# Altium schematic symbol library jlcpcb_2025_04_capacitors_extended_0805.schlib: 3281 symbols (part 6 of 18) (continued)
## C0805X7R105K500NT (continued)
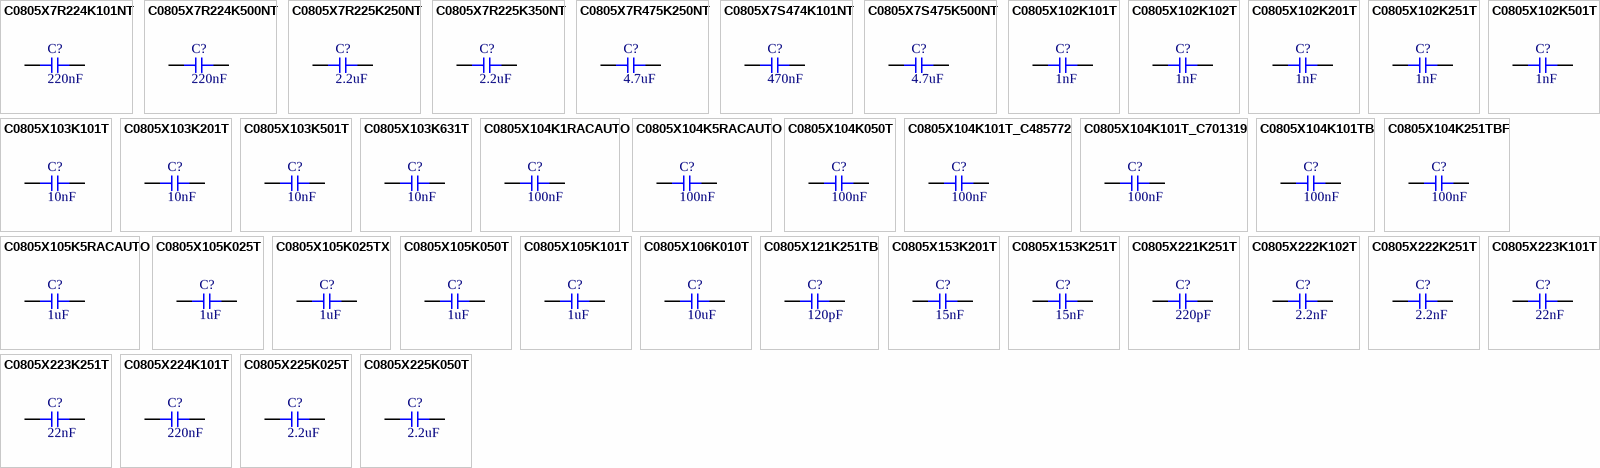
[diagram p25: symbols C0805X7R224K101NT to C0805X225K050T]

## C0805X7R224K101NT
designator C?  Capacitance: 220nF  (hidden comment: *)
Capacitor, Ceramic (MLCC), 220nF, ±10%, 100V, ±10%, SMD 0805; Manufacturer: SANYEAR; Manufacturer Part Number: C0805X7R224K101NT; Package Size: 0805; JLCPCB Basic Part: No; JLCPCB Part Number: C729464; Supplier 1: LCSC; Category: Capacitors - MLCC; Supplier Part Number 1: C729464; Tolerance: ±10%; Voltage Rating: 100V; RoHS: Yes; ComponentLink1Description: Datasheet; ComponentLink1URL: https://wmsc.lcsc.com/wmsc/upload/file/pdf/v2/lcsc/2304140030_SANYEAR-C0805X7R224K101NT_C729464.pdf; ComponentLink2Description: JLCPCB Part URL; ComponentLink2URL: https://jlcpcb.com/partdetail/C729464; ComponentLink3Description: LCSC Part URL; ComponentLink3URL: https://lcsc.com/product-detail/Multilayer-Ceramic-Capacitors-MLCC---SMD-SMT_SANYEAR-SANYEAR-C0805X7R224K101NT_C729464.html
footprint CAP-0805 (0805 (2012M) Capacitor)
pins: 1, 2

## C0805X7R224K500NT
designator C?  Capacitance: 220nF  (hidden comment: *)
Capacitor, Ceramic (MLCC), 220nF, ±10%, 50V, X7R, ±10%, SMD 0805; Manufacturer: SANYEAR; Manufacturer Part Number: C0805X7R224K500NT; Package Size: 0805; JLCPCB Basic Part: No; JLCPCB Part Number: C729463; Supplier 1: LCSC; Category: Capacitors - MLCC; Supplier Part Number 1: C729463; Tolerance: ±10%; Voltage Rating: 50V; Temperature Coefficient: X7R; RoHS: Yes; ComponentLink1Description: Datasheet; ComponentLink1URL: https://wmsc.lcsc.com/wmsc/upload/file/pdf/v2/lcsc/2304140030_SANYEAR-C0805X7R224K500NT_C729463.pdf; ComponentLink2Description: JLCPCB Part URL; ComponentLink2URL: https://jlcpcb.com/partdetail/C729463; ComponentLink3Description: LCSC Part URL; ComponentLink3URL: https://lcsc.com/product-detail/Multilayer-Ceramic-Capacitors-MLCC---SMD-SMT_SANYEAR-SANYEAR-C0805X7R224K500NT_C729463.html
footprint CAP-0805 (0805 (2012M) Capacitor)
pins: 1, 2

## C0805X7R225K250NT
designator C?  Capacitance: 2.2uF  (hidden comment: *)
Capacitor, Ceramic (MLCC), 2.2uF, ±10%, 25V, X7R, ±10%, SMD 0805; Manufacturer: SANYEAR; Manufacturer Part Number: C0805X7R225K250NT; Package Size: 0805; JLCPCB Basic Part: No; JLCPCB Part Number: C466790; Supplier 1: LCSC; Category: Capacitors - MLCC; Supplier Part Number 1: C466790; Tolerance: ±10%; Voltage Rating: 25V; Temperature Coefficient: X7R; RoHS: Yes; ComponentLink1Description: Datasheet; ComponentLink1URL: https://wmsc.lcsc.com/wmsc/upload/file/pdf/v2/lcsc/2304140030_SANYEAR-C0805X7R225K250NT_C466790.pdf; ComponentLink2Description: JLCPCB Part URL; ComponentLink2URL: https://jlcpcb.com/partdetail/C466790; ComponentLink3Description: LCSC Part URL; ComponentLink3URL: https://lcsc.com/product-detail/Multilayer-Ceramic-Capacitors-MLCC---SMD-SMT_SANYEAR-SANYEAR-C0805X7R225K250NT_C466790.html
footprint CAP-0805 (0805 (2012M) Capacitor)
pins: 1, 2

## C0805X7R225K350NT
designator C?  Capacitance: 2.2uF  (hidden comment: *)
Capacitor, Ceramic (MLCC), 2.2uF, ±10%, 35V, ±10%, SMD 0805; Manufacturer: SANYEAR; Manufacturer Part Number: C0805X7R225K350NT; Package Size: 0805; JLCPCB Basic Part: No; JLCPCB Part Number: C968783; Supplier 1: LCSC; Category: Capacitors - MLCC; Supplier Part Number 1: C968783; Tolerance: ±10%; Voltage Rating: 35V; RoHS: Yes; ComponentLink1Description: Datasheet; ComponentLink2Description: JLCPCB Part URL; ComponentLink2URL: https://jlcpcb.com/partdetail/C968783; ComponentLink3Description: LCSC Part URL; ComponentLink3URL: https://lcsc.com/product-detail/Multilayer-Ceramic-Capacitors-MLCC---SMD-SMT_SANYEAR-SANYEAR-C0805X7R225K350NT_C968783.html
footprint CAP-0805 (0805 (2012M) Capacitor)
pins: 1, 2

## C0805X7R475K250NT
designator C?  Capacitance: 4.7uF  (hidden comment: *)
Capacitor, Ceramic (MLCC), 4.7uF, 25V, SMD 0805; Manufacturer: SANYEAR; Manufacturer Part Number: C0805X7R475K250NT; Package Size: 0805; JLCPCB Basic Part: No; JLCPCB Part Number: C2835535; Supplier 1: LCSC; Category: Capacitors - MLCC; Supplier Part Number 1: C2835535; Voltage Rating: 25V; RoHS: Yes; ComponentLink1Description: Datasheet; ComponentLink1URL: https://wmsc.lcsc.com/wmsc/upload/file/pdf/v2/lcsc/2304140030_SANYEAR-C0805X7R475K250NT_C2835535.pdf; ComponentLink2Description: JLCPCB Part URL; ComponentLink2URL: https://jlcpcb.com/partdetail/C2835535; ComponentLink3Description: LCSC Part URL; ComponentLink3URL: https://lcsc.com/product-detail/Multilayer-Ceramic-Capacitors-MLCC---SMD-SMT_SANYEAR-SANYEAR-C0805X7R475K250NT_C2835535.html
footprint CAP-0805 (0805 (2012M) Capacitor)
pins: 1, 2

## C0805X7S474K101NT
designator C?  Capacitance: 470nF  (hidden comment: *)
Capacitor, Ceramic (MLCC), 470nF, ±10%, 100V, X7S, ±10%, SMD 0805; Manufacturer: SANYEAR; Manufacturer Part Number: C0805X7S474K101NT; Package Size: 0805; JLCPCB Basic Part: No; JLCPCB Part Number: C2859185; Supplier 1: LCSC; Category: Capacitors - MLCC; Supplier Part Number 1: C2859185; Tolerance: ±10%; Voltage Rating: 100V; Temperature Coefficient: X7S; RoHS: Yes; ComponentLink1Description: Datasheet; ComponentLink1URL: https://wmsc.lcsc.com/wmsc/upload/file/pdf/v2/lcsc/2108170930_SANYEAR-C0805X7S474K101NT_C2859185.pdf; ComponentLink2Description: JLCPCB Part URL; ComponentLink2URL: https://jlcpcb.com/partdetail/C2859185; ComponentLink3Description: LCSC Part URL; ComponentLink3URL: https://lcsc.com/product-detail/Multilayer-Ceramic-Capacitors-MLCC---SMD-SMT_SANYEAR-SANYEAR-C0805X7S474K101NT_C2859185.html
footprint CAP-0805 (0805 (2012M) Capacitor)
pins: 1, 2

## C0805X7S475K500NT
designator C?  Capacitance: 4.7uF  (hidden comment: *)
Capacitor, Ceramic (MLCC), 4.7uF, ±10%, 50V, X7S, ±10%, SMD 0805; Manufacturer: SANYEAR; Manufacturer Part Number: C0805X7S475K500NT; Package Size: 0805; JLCPCB Basic Part: No; JLCPCB Part Number: C2859194; Supplier 1: LCSC; Category: Capacitors - MLCC; Supplier Part Number 1: C2859194; Tolerance: ±10%; Voltage Rating: 50V; Temperature Coefficient: X7S; RoHS: Yes; ComponentLink1Description: Datasheet; ComponentLink1URL: https://wmsc.lcsc.com/wmsc/upload/file/pdf/v2/lcsc/2108170930_SANYEAR-C0805X7S475K500NT_C2859194.pdf; ComponentLink2Description: JLCPCB Part URL; ComponentLink2URL: https://jlcpcb.com/partdetail/C2859194; ComponentLink3Description: LCSC Part URL; ComponentLink3URL: https://lcsc.com/product-detail/Multilayer-Ceramic-Capacitors-MLCC---SMD-SMT_SANYEAR-SANYEAR-C0805X7S475K500NT_C2859194.html
footprint CAP-0805 (0805 (2012M) Capacitor)
pins: 1, 2

## C0805X102K101T
designator C?  Capacitance: 1nF  (hidden comment: *)
Capacitor, Ceramic (MLCC), 1nF, ±10%, 100V, X7R, ±10%, SMD 0805; Manufacturer: IHHEC(HOLY STONE ENTERPRISE CO., LTD); Manufacturer Part Number: C0805X102K101T; Package Size: 0805; JLCPCB Basic Part: No; JLCPCB Part Number: C559288; Supplier 1: LCSC; Category: Capacitors - MLCC; Supplier Part Number 1: C559288; Tolerance: ±10%; Voltage Rating: 100V; Temperature Coefficient: X7R; RoHS: Yes; ComponentLink1Description: Datasheet; ComponentLink1URL: https://wmsc.lcsc.com/wmsc/upload/file/pdf/v2/lcsc/2304140030_IHHEC-HOLY-STONE-ENTERPRISE-CO---LTD-C0805X102K101T_C559288.pdf; ComponentLink2Description: JLCPCB Part URL; ComponentLink2URL: https://jlcpcb.com/partdetail/C559288; ComponentLink3Description: LCSC Part URL; ComponentLink3URL: https://lcsc.com/product-detail/Multilayer-Ceramic-Capacitors-MLCC---SMD-SMT_IHHECHOLY-STONE-ENTERPRISE-CO.%2C-LTD-IHHECHOLY-STONE-ENTERPRISE-CO.%2C-LTD-C0805X102K101T_C559288.html
footprint CAP-0805 (0805 (2012M) Capacitor)
pins: 1, 2

## C0805X102K102T
designator C?  Capacitance: 1nF  (hidden comment: *)
Capacitor, Ceramic (MLCC), 1nF, ±10%, 1kV, X7R, ±10%, SMD 0805; Manufacturer: IHHEC(HOLY STONE ENTERPRISE CO., LTD); Manufacturer Part Number: C0805X102K102T; Package Size: 0805; JLCPCB Basic Part: No; JLCPCB Part Number: C105944; Supplier 1: LCSC; Category: Capacitors - MLCC; Supplier Part Number 1: C105944; Tolerance: ±10%; Voltage Rating: 1kV; Temperature Coefficient: X7R; RoHS: Yes; ComponentLink1Description: Datasheet; ComponentLink1URL: https://wmsc.lcsc.com/wmsc/upload/file/pdf/v2/lcsc/2304140030_IHHEC-HOLY-STONE-ENTERPRISE-CO---LTD-C0805X102K102T_C105944.pdf; ComponentLink2Description: JLCPCB Part URL; ComponentLink2URL: https://jlcpcb.com/partdetail/C105944; ComponentLink3Description: LCSC Part URL; ComponentLink3URL: https://lcsc.com/product-detail/Multilayer-Ceramic-Capacitors-MLCC---SMD-SMT_IHHECHOLY-STONE-ENTERPRISE-CO.%2C-LTD-IHHECHOLY-STONE-ENTERPRISE-CO.%2C-LTD-C0805X102K102T_C105944.html
footprint CAP-0805 (0805 (2012M) Capacitor)
pins: 1, 2

## C0805X102K201T
designator C?  Capacitance: 1nF  (hidden comment: *)
Capacitor, Ceramic (MLCC), 1nF, ±10%, 200V, X7R, ±10%, SMD 0805; Manufacturer: IHHEC(HOLY STONE ENTERPRISE CO., LTD); Manufacturer Part Number: C0805X102K201T; Package Size: 0805; JLCPCB Basic Part: No; JLCPCB Part Number: C559286; Supplier 1: LCSC; Category: Capacitors - MLCC; Supplier Part Number 1: C559286; Tolerance: ±10%; Voltage Rating: 200V; Temperature Coefficient: X7R; RoHS: Yes; ComponentLink1Description: Datasheet; ComponentLink1URL: https://wmsc.lcsc.com/wmsc/upload/file/pdf/v2/lcsc/2304140030_IHHEC-HOLY-STONE-ENTERPRISE-CO---LTD-C0805X102K201T_C559286.pdf; ComponentLink2Description: JLCPCB Part URL; ComponentLink2URL: https://jlcpcb.com/partdetail/C559286; ComponentLink3Description: LCSC Part URL; ComponentLink3URL: https://lcsc.com/product-detail/Multilayer-Ceramic-Capacitors-MLCC---SMD-SMT_IHHECHOLY-STONE-ENTERPRISE-CO.%2C-LTD-IHHECHOLY-STONE-ENTERPRISE-CO.%2C-LTD-C0805X102K201T_C559286.html
footprint CAP-0805 (0805 (2012M) Capacitor)
pins: 1, 2

## C0805X102K251T
designator C?  Capacitance: 1nF  (hidden comment: *)
Capacitor, Ceramic (MLCC), 1nF, ±10%, 250V, X7R, ±10%, SMD 0805; Manufacturer: IHHEC(HOLY STONE ENTERPRISE CO., LTD); Manufacturer Part Number: C0805X102K251T; Package Size: 0805; JLCPCB Basic Part: No; JLCPCB Part Number: C105945; Supplier 1: LCSC; Category: Capacitors - MLCC; Supplier Part Number 1: C105945; Tolerance: ±10%; Voltage Rating: 250V; Temperature Coefficient: X7R; RoHS: Yes; ComponentLink1Description: Datasheet; ComponentLink1URL: https://wmsc.lcsc.com/wmsc/upload/file/pdf/v2/lcsc/2304140030_IHHEC-HOLY-STONE-ENTERPRISE-CO---LTD-C0805X102K251T_C105945.pdf; ComponentLink2Description: JLCPCB Part URL; ComponentLink2URL: https://jlcpcb.com/partdetail/C105945; ComponentLink3Description: LCSC Part URL; ComponentLink3URL: https://lcsc.com/product-detail/Multilayer-Ceramic-Capacitors-MLCC---SMD-SMT_IHHECHOLY-STONE-ENTERPRISE-CO.%2C-LTD-IHHECHOLY-STONE-ENTERPRISE-CO.%2C-LTD-C0805X102K251T_C105945.html
footprint CAP-0805 (0805 (2012M) Capacitor)
pins: 1, 2

## C0805X102K501T
designator C?  Capacitance: 1nF  (hidden comment: *)
Capacitor, Ceramic (MLCC), 1nF, ±10%, 500V, X7R, ±10%, SMD 0805; Manufacturer: IHHEC(HOLY STONE ENTERPRISE CO., LTD); Manufacturer Part Number: C0805X102K501T; Package Size: 0805; JLCPCB Basic Part: No; JLCPCB Part Number: C105946; Supplier 1: LCSC; Category: Capacitors - MLCC; Supplier Part Number 1: C105946; Tolerance: ±10%; Voltage Rating: 500V; Temperature Coefficient: X7R; RoHS: Yes; ComponentLink1Description: Datasheet; ComponentLink1URL: https://wmsc.lcsc.com/wmsc/upload/file/pdf/v2/lcsc/2304140030_IHHEC-HOLY-STONE-ENTERPRISE-CO---LTD-C0805X102K501T_C105946.pdf; ComponentLink2Description: JLCPCB Part URL; ComponentLink2URL: https://jlcpcb.com/partdetail/C105946; ComponentLink3Description: LCSC Part URL; ComponentLink3URL: https://lcsc.com/product-detail/Multilayer-Ceramic-Capacitors-MLCC---SMD-SMT_IHHECHOLY-STONE-ENTERPRISE-CO.%2C-LTD-IHHECHOLY-STONE-ENTERPRISE-CO.%2C-LTD-C0805X102K501T_C105946.html
footprint CAP-0805 (0805 (2012M) Capacitor)
pins: 1, 2

## C0805X103K101T
designator C?  Capacitance: 10nF  (hidden comment: *)
Capacitor, Ceramic (MLCC), 10nF, ±10%, 100V, X7R, ±10%, SMD 0805; Manufacturer: IHHEC(HOLY STONE ENTERPRISE CO., LTD); Manufacturer Part Number: C0805X103K101T; Package Size: 0805; JLCPCB Basic Part: No; JLCPCB Part Number: C105947; Supplier 1: LCSC; Category: Capacitors - MLCC; Supplier Part Number 1: C105947; Tolerance: ±10%; Voltage Rating: 100V; Temperature Coefficient: X7R; RoHS: Yes; ComponentLink1Description: Datasheet; ComponentLink1URL: https://wmsc.lcsc.com/wmsc/upload/file/pdf/v2/lcsc/2304140030_IHHEC-HOLY-STONE-ENTERPRISE-CO---LTD-C0805X103K101T_C105947.pdf; ComponentLink2Description: JLCPCB Part URL; ComponentLink2URL: https://jlcpcb.com/partdetail/C105947; ComponentLink3Description: LCSC Part URL; ComponentLink3URL: https://lcsc.com/product-detail/Multilayer-Ceramic-Capacitors-MLCC---SMD-SMT_IHHECHOLY-STONE-ENTERPRISE-CO.%2C-LTD-IHHECHOLY-STONE-ENTERPRISE-CO.%2C-LTD-C0805X103K101T_C105947.html
footprint CAP-0805 (0805 (2012M) Capacitor)
pins: 1, 2

## C0805X103K201T
designator C?  Capacitance: 10nF  (hidden comment: *)
Capacitor, Ceramic (MLCC), 10nF, ±10%, 200V, X7R, ±10%, SMD 0805; Manufacturer: IHHEC(HOLY STONE ENTERPRISE CO., LTD); Manufacturer Part Number: C0805X103K201T; Package Size: 0805; JLCPCB Basic Part: No; JLCPCB Part Number: C105948; Supplier 1: LCSC; Category: Capacitors - MLCC; Supplier Part Number 1: C105948; Tolerance: ±10%; Voltage Rating: 200V; Temperature Coefficient: X7R; RoHS: Yes; ComponentLink1Description: Datasheet; ComponentLink1URL: https://wmsc.lcsc.com/wmsc/upload/file/pdf/v2/lcsc/2304140030_IHHEC-HOLY-STONE-ENTERPRISE-CO---LTD-C0805X103K201T_C105948.pdf; ComponentLink2Description: JLCPCB Part URL; ComponentLink2URL: https://jlcpcb.com/partdetail/C105948; ComponentLink3Description: LCSC Part URL; ComponentLink3URL: https://lcsc.com/product-detail/Multilayer-Ceramic-Capacitors-MLCC---SMD-SMT_IHHECHOLY-STONE-ENTERPRISE-CO.%2C-LTD-IHHECHOLY-STONE-ENTERPRISE-CO.%2C-LTD-C0805X103K201T_C105948.html
footprint CAP-0805 (0805 (2012M) Capacitor)
pins: 1, 2

## C0805X103K501T
designator C?  Capacitance: 10nF  (hidden comment: *)
Capacitor, Ceramic (MLCC), 10nF, ±10%, 500V, X7R, ±10%, SMD 0805; Manufacturer: IHHEC(HOLY STONE ENTERPRISE CO., LTD); Manufacturer Part Number: C0805X103K501T; Package Size: 0805; JLCPCB Basic Part: No; JLCPCB Part Number: C105950; Supplier 1: LCSC; Category: Capacitors - MLCC; Supplier Part Number 1: C105950; Tolerance: ±10%; Voltage Rating: 500V; Temperature Coefficient: X7R; RoHS: Yes; ComponentLink1Description: Datasheet; ComponentLink1URL: https://wmsc.lcsc.com/wmsc/upload/file/pdf/v2/lcsc/2304140030_IHHEC-HOLY-STONE-ENTERPRISE-CO---LTD-C0805X103K501T_C105950.pdf; ComponentLink2Description: JLCPCB Part URL; ComponentLink2URL: https://jlcpcb.com/partdetail/C105950; ComponentLink3Description: LCSC Part URL; ComponentLink3URL: https://lcsc.com/product-detail/Multilayer-Ceramic-Capacitors-MLCC---SMD-SMT_IHHECHOLY-STONE-ENTERPRISE-CO.%2C-LTD-IHHECHOLY-STONE-ENTERPRISE-CO.%2C-LTD-C0805X103K501T_C105950.html
footprint CAP-0805 (0805 (2012M) Capacitor)
pins: 1, 2

## C0805X103K631T
designator C?  Capacitance: 10nF  (hidden comment: *)
Capacitor, Ceramic (MLCC), 10nF, ±10%, 630V, X7R, ±10%, SMD 0805; Manufacturer: IHHEC(HOLY STONE ENTERPRISE CO., LTD); Manufacturer Part Number: C0805X103K631T; Package Size: 0805; JLCPCB Basic Part: No; JLCPCB Part Number: C2998552; Supplier 1: LCSC; Category: Capacitors - MLCC; Supplier Part Number 1: C2998552; Tolerance: ±10%; Voltage Rating: 630V; Temperature Coefficient: X7R; RoHS: Yes; ComponentLink1Description: Datasheet; ComponentLink1URL: https://wmsc.lcsc.com/wmsc/upload/file/pdf/v2/lcsc/2205061616_IHHEC-HOLY-STONE-ENTERPRISE-CO---LTD-C0805X103K631T_C2998552.pdf; ComponentLink2Description: JLCPCB Part URL; ComponentLink2URL: https://jlcpcb.com/partdetail/C2998552; ComponentLink3Description: LCSC Part URL; ComponentLink3URL: https://lcsc.com/product-detail/Multilayer-Ceramic-Capacitors-MLCC---SMD-SMT_IHHECHOLY-STONE-ENTERPRISE-CO.%2C-LTD-IHHECHOLY-STONE-ENTERPRISE-CO.%2C-LTD-C0805X103K631T_C2998552.html
footprint CAP-0805 (0805 (2012M) Capacitor)
pins: 1, 2

## C0805X104K1RACAUTO
designator C?  Capacitance: 100nF  (hidden comment: *)
Capacitor, Ceramic (MLCC), 100nF, ±10%, 100V, X7R, ±10%, SMD 0805; Manufacturer: KEMET; Manufacturer Part Number: C0805X104K1RACAUTO; Package Size: 0805; JLCPCB Basic Part: No; JLCPCB Part Number: C561838; Supplier 1: LCSC; Category: Capacitors - MLCC; Supplier Part Number 1: C561838; Tolerance: ±10%; Voltage Rating: 100V; Temperature Coefficient: X7R; RoHS: Yes; ComponentLink1Description: Datasheet; ComponentLink1URL: https://wmsc.lcsc.com/wmsc/upload/file/pdf/v2/lcsc/2304140030_KEMET-C0805X104K1RACAUTO_C561838.pdf; ComponentLink2Description: JLCPCB Part URL; ComponentLink2URL: https://jlcpcb.com/partdetail/C561838; ComponentLink3Description: LCSC Part URL; ComponentLink3URL: https://lcsc.com/product-detail/Multilayer-Ceramic-Capacitors-MLCC---SMD-SMT_KEMET-KEMET-C0805X104K1RACAUTO_C561838.html
footprint CAP-0805 (0805 (2012M) Capacitor)
pins: 1, 2

## C0805X104K5RACAUTO
designator C?  Capacitance: 100nF  (hidden comment: *)
Capacitor, Ceramic (MLCC), 100nF, ±10%, 50V, X7R, ±10%, SMD 0805; Manufacturer: KEMET; Manufacturer Part Number: C0805X104K5RACAUTO; Package Size: 0805; JLCPCB Basic Part: No; JLCPCB Part Number: C141172; Supplier 1: LCSC; Category: Capacitors - MLCC; Supplier Part Number 1: C141172; Tolerance: ±10%; Voltage Rating: 50V; Temperature Coefficient: X7R; RoHS: Yes; ComponentLink1Description: Datasheet; ComponentLink1URL: https://wmsc.lcsc.com/wmsc/upload/file/pdf/v2/lcsc/2304140030_KEMET-C0805X104K5RACAUTO_C141172.pdf; ComponentLink2Description: JLCPCB Part URL; ComponentLink2URL: https://jlcpcb.com/partdetail/C141172; ComponentLink3Description: LCSC Part URL; ComponentLink3URL: https://lcsc.com/product-detail/Multilayer-Ceramic-Capacitors-MLCC---SMD-SMT_KEMET-KEMET-C0805X104K5RACAUTO_C141172.html
footprint CAP-0805 (0805 (2012M) Capacitor)
pins: 1, 2

## C0805X104K050T
designator C?  Capacitance: 100nF  (hidden comment: *)
Capacitor, Ceramic (MLCC), 100nF, ±10%, 50V, X7R, ±10%, SMD 0805; Manufacturer: IHHEC(HOLY STONE ENTERPRISE CO., LTD); Manufacturer Part Number: C0805X104K050T; Package Size: 0805; JLCPCB Basic Part: No; JLCPCB Part Number: C502153; Supplier 1: LCSC; Category: Capacitors - MLCC; Supplier Part Number 1: C502153; Tolerance: ±10%; Voltage Rating: 50V; Temperature Coefficient: X7R; RoHS: Yes; ComponentLink1Description: Datasheet; ComponentLink1URL: https://wmsc.lcsc.com/wmsc/upload/file/pdf/v2/lcsc/2304140030_IHHEC-HOLY-STONE-ENTERPRISE-CO---LTD-C0805X104K050T_C502153.pdf; ComponentLink2Description: JLCPCB Part URL; ComponentLink2URL: https://jlcpcb.com/partdetail/C502153; ComponentLink3Description: LCSC Part URL; ComponentLink3URL: https://lcsc.com/product-detail/Multilayer-Ceramic-Capacitors-MLCC---SMD-SMT_IHHECHOLY-STONE-ENTERPRISE-CO.%2C-LTD-IHHECHOLY-STONE-ENTERPRISE-CO.%2C-LTD-C0805X104K050T_C502153.html
footprint CAP-0805 (0805 (2012M) Capacitor)
pins: 1, 2

## C0805X104K101T_C485772
designator C?  Capacitance: 100nF  (hidden comment: *)
Capacitor, Ceramic (MLCC), 100nF, ±10%, 100V, X7R, ±10%, SMD 0805; Manufacturer: IHHEC(HOLY STONE ENTERPRISE CO., LTD); Manufacturer Part Number: C0805X104K101T; Package Size: 0805; JLCPCB Basic Part: No; JLCPCB Part Number: C485772; Supplier 1: LCSC; Category: Capacitors - MLCC; Supplier Part Number 1: C485772; Tolerance: ±10%; Voltage Rating: 100V; Temperature Coefficient: X7R; RoHS: Yes; ComponentLink1Description: Datasheet; ComponentLink1URL: https://wmsc.lcsc.com/wmsc/upload/file/pdf/v2/lcsc/2304140030_IHHEC-HOLY-STONE-ENTERPRISE-CO---LTD-C0805X104K101T_C485772.pdf; ComponentLink2Description: JLCPCB Part URL; ComponentLink2URL: https://jlcpcb.com/partdetail/C485772; ComponentLink3Description: LCSC Part URL; ComponentLink3URL: https://lcsc.com/product-detail/Multilayer-Ceramic-Capacitors-MLCC---SMD-SMT_IHHECHOLY-STONE-ENTERPRISE-CO.%2C-LTD-IHHECHOLY-STONE-ENTERPRISE-CO.%2C-LTD-C0805X104K101T_C485772.html
footprint CAP-0805 (0805 (2012M) Capacitor)
pins: 1, 2

## C0805X104K101T_C701319
designator C?  Capacitance: 100nF  (hidden comment: *)
Capacitor, Ceramic (MLCC), 100nF, ±10%, 100V, X7R, ±10%, SMD 0805; Manufacturer: IHHEC(HOLY STONE ENTERPRISE CO., LTD); Manufacturer Part Number: C0805X104K101T; Package Size: 0805; JLCPCB Basic Part: No; JLCPCB Part Number: C701319; Supplier 1: LCSC; Category: Capacitors - MLCC; Supplier Part Number 1: C701319; Tolerance: ±10%; Voltage Rating: 100V; Temperature Coefficient: X7R; RoHS: Yes; ComponentLink1Description: Datasheet; ComponentLink1URL: https://wmsc.lcsc.com/wmsc/upload/file/pdf/v2/lcsc/2304140030_IHHEC-HOLY-STONE-ENTERPRISE-CO---LTD-C0805X104K101T_C701319.pdf; ComponentLink2Description: JLCPCB Part URL; ComponentLink2URL: https://jlcpcb.com/partdetail/C701319; ComponentLink3Description: LCSC Part URL; ComponentLink3URL: https://lcsc.com/product-detail/Multilayer-Ceramic-Capacitors-MLCC---SMD-SMT_IHHECHOLY-STONE-ENTERPRISE-CO.%2C-LTD-IHHECHOLY-STONE-ENTERPRISE-CO.%2C-LTD-C0805X104K101T_C701319.html
footprint CAP-0805 (0805 (2012M) Capacitor)
pins: 1, 2

## C0805X104K101TB
designator C?  Capacitance: 100nF  (hidden comment: *)
Capacitor, Ceramic (MLCC), 100nF, ±10%, 100V, ±10%, SMD 0805; Manufacturer: IHHEC(HOLY STONE ENTERPRISE CO., LTD); Manufacturer Part Number: C0805X104K101TB; Package Size: 0805; JLCPCB Basic Part: No; JLCPCB Part Number: C495959; Supplier 1: LCSC; Category: Capacitors - MLCC; Supplier Part Number 1: C495959; Tolerance: ±10%; Voltage Rating: 100V; RoHS: Yes; ComponentLink1Description: Datasheet; ComponentLink1URL: https://wmsc.lcsc.com/wmsc/upload/file/pdf/v2/lcsc/2304140030_IHHEC-HOLY-STONE-ENTERPRISE-CO---LTD-C0805X104K101TB_C495959.pdf; ComponentLink2Description: JLCPCB Part URL; ComponentLink2URL: https://jlcpcb.com/partdetail/C495959; ComponentLink3Description: LCSC Part URL; ComponentLink3URL: https://lcsc.com/product-detail/Multilayer-Ceramic-Capacitors-MLCC---SMD-SMT_IHHECHOLY-STONE-ENTERPRISE-CO.%2C-LTD-IHHECHOLY-STONE-ENTERPRISE-CO.%2C-LTD-C0805X104K101TB_C495959.html
footprint CAP-0805 (0805 (2012M) Capacitor)
pins: 1, 2

## C0805X104K251TBF
designator C?  Capacitance: 100nF  (hidden comment: *)
Capacitor, Ceramic (MLCC), 100nF, 250V, X7R, SMD 0805; Manufacturer: IHHEC(HOLY STONE ENTERPRISE CO., LTD); Manufacturer Part Number: C0805X104K251TBF; Package Size: 0805; JLCPCB Basic Part: No; JLCPCB Part Number: C2991918; Supplier 1: LCSC; Category: Capacitors - MLCC; Supplier Part Number 1: C2991918; Voltage Rating: 250V; Temperature Coefficient: X7R; RoHS: Yes; ComponentLink1Description: Datasheet; ComponentLink1URL: https://wmsc.lcsc.com/wmsc/upload/file/pdf/v2/lcsc/2204131745_IHHEC-HOLY-STONE-ENTERPRISE-CO---LTD-C0805X104K251TBF_C2991918.pdf; ComponentLink2Description: JLCPCB Part URL; ComponentLink2URL: https://jlcpcb.com/partdetail/C2991918; ComponentLink3Description: LCSC Part URL; ComponentLink3URL: https://lcsc.com/product-detail/Multilayer-Ceramic-Capacitors-MLCC---SMD-SMT_IHHECHOLY-STONE-ENTERPRISE-CO.%2C-LTD-IHHECHOLY-STONE-ENTERPRISE-CO.%2C-LTD-C0805X104K251TBF_C2991918.html
footprint CAP-0805 (0805 (2012M) Capacitor)
pins: 1, 2

## C0805X105K5RACAUTO
designator C?  Capacitance: 1uF  (hidden comment: *)
Capacitor, Ceramic (MLCC), 1uF, ±10%, 50V, X7R, ±10%, SMD 0805; Manufacturer: KEMET; Manufacturer Part Number: C0805X105K5RACAUTO; Package Size: 0805; JLCPCB Basic Part: No; JLCPCB Part Number: C3858054; Supplier 1: LCSC; Category: Capacitors - MLCC; Supplier Part Number 1: C3858054; Tolerance: ±10%; Voltage Rating: 50V; Temperature Coefficient: X7R; RoHS: Yes; ComponentLink1Description: Datasheet; ComponentLink1URL: https://wmsc.lcsc.com/wmsc/upload/file/pdf/v2/lcsc/2401181633_KEMET-C0805X105K5RACAUTO_C3858054.pdf; ComponentLink2Description: JLCPCB Part URL; ComponentLink2URL: https://jlcpcb.com/partdetail/C3858054; ComponentLink3Description: LCSC Part URL; ComponentLink3URL: https://lcsc.com/product-detail/Multilayer-Ceramic-Capacitors-MLCC---SMD-SMT_KEMET-KEMET-C0805X105K5RACAUTO_C3858054.html
footprint CAP-0805 (0805 (2012M) Capacitor)
pins: 1, 2

## C0805X105K025T
designator C?  Capacitance: 1uF  (hidden comment: *)
Capacitor, Ceramic (MLCC), 1uF, ±10%, 25V, X7R, ±10%, SMD 0805; Manufacturer: IHHEC(HOLY STONE ENTERPRISE CO., LTD); Manufacturer Part Number: C0805X105K025T; Package Size: 0805; JLCPCB Basic Part: No; JLCPCB Part Number: C915845; Supplier 1: LCSC; Category: Capacitors - MLCC; Supplier Part Number 1: C915845; Tolerance: ±10%; Voltage Rating: 25V; Temperature Coefficient: X7R; RoHS: Yes; ComponentLink1Description: Datasheet; ComponentLink1URL: https://wmsc.lcsc.com/wmsc/upload/file/pdf/v2/lcsc/2304140030_IHHEC-HOLY-STONE-ENTERPRISE-CO---LTD-C0805X105K025T_C915845.pdf; ComponentLink2Description: JLCPCB Part URL; ComponentLink2URL: https://jlcpcb.com/partdetail/C915845; ComponentLink3Description: LCSC Part URL; ComponentLink3URL: https://lcsc.com/product-detail/Multilayer-Ceramic-Capacitors-MLCC---SMD-SMT_IHHECHOLY-STONE-ENTERPRISE-CO.%2C-LTD-IHHECHOLY-STONE-ENTERPRISE-CO.%2C-LTD-C0805X105K025T_C915845.html
footprint CAP-0805 (0805 (2012M) Capacitor)
pins: 1, 2

## C0805X105K025TX
designator C?  Capacitance: 1uF  (hidden comment: *)
Capacitor, Ceramic (MLCC), 1uF, ±10%, 25V, X7R, ±10%, SMD 0805; Manufacturer: IHHEC(HOLY STONE ENTERPRISE CO., LTD); Manufacturer Part Number: C0805X105K025TX; Package Size: 0805; JLCPCB Basic Part: No; JLCPCB Part Number: C2940738; Supplier 1: LCSC; Category: Capacitors - MLCC; Supplier Part Number 1: C2940738; Tolerance: ±10%; Voltage Rating: 25V; Temperature Coefficient: X7R; RoHS: Yes; ComponentLink1Description: Datasheet; ComponentLink1URL: https://wmsc.lcsc.com/wmsc/upload/file/pdf/v2/lcsc/2201121900_IHHEC-HOLY-STONE-ENTERPRISE-CO---LTD-C0805X105K025TX_C2940738.pdf; ComponentLink2Description: JLCPCB Part URL; ComponentLink2URL: https://jlcpcb.com/partdetail/C2940738; ComponentLink3Description: LCSC Part URL; ComponentLink3URL: https://lcsc.com/product-detail/Multilayer-Ceramic-Capacitors-MLCC---SMD-SMT_IHHECHOLY-STONE-ENTERPRISE-CO.%2C-LTD-IHHECHOLY-STONE-ENTERPRISE-CO.%2C-LTD-C0805X105K025TX_C2940738.html
footprint CAP-0805 (0805 (2012M) Capacitor)
pins: 1, 2

## C0805X105K050T
designator C?  Capacitance: 1uF  (hidden comment: *)
Capacitor, Ceramic (MLCC), 1uF, ±10%, 50V, X7R, ±10%, SMD 0805; Manufacturer: IHHEC(HOLY STONE ENTERPRISE CO., LTD); Manufacturer Part Number: C0805X105K050T; Package Size: 0805; JLCPCB Basic Part: No; JLCPCB Part Number: C340303; Supplier 1: LCSC; Category: Capacitors - MLCC; Supplier Part Number 1: C340303; Tolerance: ±10%; Voltage Rating: 50V; Temperature Coefficient: X7R; RoHS: Yes; ComponentLink1Description: Datasheet; ComponentLink1URL: https://wmsc.lcsc.com/wmsc/upload/file/pdf/v2/lcsc/2304140030_IHHEC-HOLY-STONE-ENTERPRISE-CO---LTD-C0805X105K050T_C340303.pdf; ComponentLink2Description: JLCPCB Part URL; ComponentLink2URL: https://jlcpcb.com/partdetail/C340303; ComponentLink3Description: LCSC Part URL; ComponentLink3URL: https://lcsc.com/product-detail/Multilayer-Ceramic-Capacitors-MLCC---SMD-SMT_IHHECHOLY-STONE-ENTERPRISE-CO.%2C-LTD-IHHECHOLY-STONE-ENTERPRISE-CO.%2C-LTD-C0805X105K050T_C340303.html
footprint CAP-0805 (0805 (2012M) Capacitor)
pins: 1, 2

## C0805X105K101T
designator C?  Capacitance: 1uF  (hidden comment: *)
Capacitor, Ceramic (MLCC), 1uF, ±10%, 100V, X7R, ±10%, SMD 0805; Manufacturer: IHHEC(HOLY STONE ENTERPRISE CO., LTD); Manufacturer Part Number: C0805X105K101T; Package Size: 0805; JLCPCB Basic Part: No; JLCPCB Part Number: C105952; Supplier 1: LCSC; Category: Capacitors - MLCC; Supplier Part Number 1: C105952; Tolerance: ±10%; Voltage Rating: 100V; Temperature Coefficient: X7R; RoHS: Yes; ComponentLink1Description: Datasheet; ComponentLink1URL: https://wmsc.lcsc.com/wmsc/upload/file/pdf/v2/lcsc/2304140030_IHHEC-HOLY-STONE-ENTERPRISE-CO---LTD-C0805X105K101T_C105952.pdf; ComponentLink2Description: JLCPCB Part URL; ComponentLink2URL: https://jlcpcb.com/partdetail/C105952; ComponentLink3Description: LCSC Part URL; ComponentLink3URL: https://lcsc.com/product-detail/Multilayer-Ceramic-Capacitors-MLCC---SMD-SMT_IHHECHOLY-STONE-ENTERPRISE-CO.%2C-LTD-IHHECHOLY-STONE-ENTERPRISE-CO.%2C-LTD-C0805X105K101T_C105952.html
footprint CAP-0805 (0805 (2012M) Capacitor)
pins: 1, 2

## C0805X106K010T
designator C?  Capacitance: 10uF  (hidden comment: *)
Capacitor, Ceramic (MLCC), 10uF, ±10%, 10V, X7R, ±10%, SMD 0805; Manufacturer: IHHEC(HOLY STONE ENTERPRISE CO., LTD); Manufacturer Part Number: C0805X106K010T; Package Size: 0805; JLCPCB Basic Part: No; JLCPCB Part Number: C340314; Supplier 1: LCSC; Category: Capacitors - MLCC; Supplier Part Number 1: C340314; Tolerance: ±10%; Voltage Rating: 10V; Temperature Coefficient: X7R; RoHS: Yes; ComponentLink1Description: Datasheet; ComponentLink1URL: https://wmsc.lcsc.com/wmsc/upload/file/pdf/v2/lcsc/2304140030_IHHEC-HOLY-STONE-ENTERPRISE-CO---LTD-C0805X106K010T_C340314.pdf; ComponentLink2Description: JLCPCB Part URL; ComponentLink2URL: https://jlcpcb.com/partdetail/C340314; ComponentLink3Description: LCSC Part URL; ComponentLink3URL: https://lcsc.com/product-detail/Multilayer-Ceramic-Capacitors-MLCC---SMD-SMT_IHHECHOLY-STONE-ENTERPRISE-CO.%2C-LTD-IHHECHOLY-STONE-ENTERPRISE-CO.%2C-LTD-C0805X106K010T_C340314.html
footprint CAP-0805 (0805 (2012M) Capacitor)
pins: 1, 2

## C0805X121K251TB
designator C?  Capacitance: 120pF  (hidden comment: *)
Capacitor, Ceramic (MLCC), 120pF, ±10%, 250V, X7R, ±10%, SMD 0805; Manufacturer: IHHEC(HOLY STONE ENTERPRISE CO., LTD); Manufacturer Part Number: C0805X121K251TB; Package Size: 0805; JLCPCB Basic Part: No; JLCPCB Part Number: C559298; Supplier 1: LCSC; Category: Capacitors - MLCC; Supplier Part Number 1: C559298; Tolerance: ±10%; Voltage Rating: 250V; Temperature Coefficient: X7R; RoHS: Yes; ComponentLink1Description: Datasheet; ComponentLink1URL: https://wmsc.lcsc.com/wmsc/upload/file/pdf/v2/lcsc/2304140030_IHHEC-HOLY-STONE-ENTERPRISE-CO---LTD-C0805X121K251TB_C559298.pdf; ComponentLink2Description: JLCPCB Part URL; ComponentLink2URL: https://jlcpcb.com/partdetail/C559298; ComponentLink3Description: LCSC Part URL; ComponentLink3URL: https://lcsc.com/product-detail/Multilayer-Ceramic-Capacitors-MLCC---SMD-SMT_IHHECHOLY-STONE-ENTERPRISE-CO.%2C-LTD-IHHECHOLY-STONE-ENTERPRISE-CO.%2C-LTD-C0805X121K251TB_C559298.html
footprint CAP-0805 (0805 (2012M) Capacitor)
pins: 1, 2

## C0805X153K201T
designator C?  Capacitance: 15nF  (hidden comment: *)
Capacitor, Ceramic (MLCC), 15nF, ±10%, 200V, X7R, ±10%, SMD 0805; Manufacturer: IHHEC(HOLY STONE ENTERPRISE CO., LTD); Manufacturer Part Number: C0805X153K201T; Package Size: 0805; JLCPCB Basic Part: No; JLCPCB Part Number: C2915743; Supplier 1: LCSC; Category: Capacitors - MLCC; Supplier Part Number 1: C2915743; Tolerance: ±10%; Voltage Rating: 200V; Temperature Coefficient: X7R; RoHS: Yes; ComponentLink1Description: Datasheet; ComponentLink1URL: https://wmsc.lcsc.com/wmsc/upload/file/pdf/v2/lcsc/2204081830_IHHEC-HOLY-STONE-ENTERPRISE-CO---LTD-C0805X153K201T_C2915743.pdf; ComponentLink2Description: JLCPCB Part URL; ComponentLink2URL: https://jlcpcb.com/partdetail/C2915743; ComponentLink3Description: LCSC Part URL; ComponentLink3URL: https://lcsc.com/product-detail/Multilayer-Ceramic-Capacitors-MLCC---SMD-SMT_IHHECHOLY-STONE-ENTERPRISE-CO.%2C-LTD-IHHECHOLY-STONE-ENTERPRISE-CO.%2C-LTD-C0805X153K201T_C2915743.html
footprint CAP-0805 (0805 (2012M) Capacitor)
pins: 1, 2

## C0805X153K251T
designator C?  Capacitance: 15nF  (hidden comment: *)
Capacitor, Ceramic (MLCC), 15nF, ±10%, 250V, X7R, ±10%, SMD 0805; Manufacturer: IHHEC(HOLY STONE ENTERPRISE CO., LTD); Manufacturer Part Number: C0805X153K251T; Package Size: 0805; JLCPCB Basic Part: No; JLCPCB Part Number: C105953; Supplier 1: LCSC; Category: Capacitors - MLCC; Supplier Part Number 1: C105953; Tolerance: ±10%; Voltage Rating: 250V; Temperature Coefficient: X7R; RoHS: Yes; ComponentLink1Description: Datasheet; ComponentLink1URL: https://wmsc.lcsc.com/wmsc/upload/file/pdf/v2/lcsc/2304140030_IHHEC-HOLY-STONE-ENTERPRISE-CO---LTD-C0805X153K251T_C105953.pdf; ComponentLink2Description: JLCPCB Part URL; ComponentLink2URL: https://jlcpcb.com/partdetail/C105953; ComponentLink3Description: LCSC Part URL; ComponentLink3URL: https://lcsc.com/product-detail/Multilayer-Ceramic-Capacitors-MLCC---SMD-SMT_IHHECHOLY-STONE-ENTERPRISE-CO.%2C-LTD-IHHECHOLY-STONE-ENTERPRISE-CO.%2C-LTD-C0805X153K251T_C105953.html
footprint CAP-0805 (0805 (2012M) Capacitor)
pins: 1, 2

## C0805X221K251T
designator C?  Capacitance: 220pF  (hidden comment: *)
Capacitor, Ceramic (MLCC), 220pF, ±10%, 250V, X7R, ±10%, SMD 0805; Manufacturer: IHHEC(HOLY STONE ENTERPRISE CO., LTD); Manufacturer Part Number: C0805X221K251T; Package Size: 0805; JLCPCB Basic Part: No; JLCPCB Part Number: C105954; Supplier 1: LCSC; Category: Capacitors - MLCC; Supplier Part Number 1: C105954; Tolerance: ±10%; Voltage Rating: 250V; Temperature Coefficient: X7R; RoHS: Yes; ComponentLink1Description: Datasheet; ComponentLink1URL: https://wmsc.lcsc.com/wmsc/upload/file/pdf/v2/lcsc/2304140030_IHHEC-HOLY-STONE-ENTERPRISE-CO---LTD-C0805X221K251T_C105954.pdf; ComponentLink2Description: JLCPCB Part URL; ComponentLink2URL: https://jlcpcb.com/partdetail/C105954; ComponentLink3Description: LCSC Part URL; ComponentLink3URL: https://lcsc.com/product-detail/Multilayer-Ceramic-Capacitors-MLCC---SMD-SMT_IHHECHOLY-STONE-ENTERPRISE-CO.%2C-LTD-IHHECHOLY-STONE-ENTERPRISE-CO.%2C-LTD-C0805X221K251T_C105954.html
footprint CAP-0805 (0805 (2012M) Capacitor)
pins: 1, 2

## C0805X222K102T
designator C?  Capacitance: 2.2nF  (hidden comment: *)
Capacitor, Ceramic (MLCC), 2.2nF, ±10%, 1kV, X7R, ±10%, SMD 0805; Manufacturer: IHHEC(HOLY STONE ENTERPRISE CO., LTD); Manufacturer Part Number: C0805X222K102T; Package Size: 0805; JLCPCB Basic Part: No; JLCPCB Part Number: C2998535; Supplier 1: LCSC; Category: Capacitors - MLCC; Supplier Part Number 1: C2998535; Tolerance: ±10%; Voltage Rating: 1kV; Temperature Coefficient: X7R; RoHS: Yes; ComponentLink1Description: Datasheet; ComponentLink1URL: https://wmsc.lcsc.com/wmsc/upload/file/pdf/v2/lcsc/2205061616_IHHEC-HOLY-STONE-ENTERPRISE-CO---LTD-C0805X222K102T_C2998535.pdf; ComponentLink2Description: JLCPCB Part URL; ComponentLink2URL: https://jlcpcb.com/partdetail/C2998535; ComponentLink3Description: LCSC Part URL; ComponentLink3URL: https://lcsc.com/product-detail/Multilayer-Ceramic-Capacitors-MLCC---SMD-SMT_IHHECHOLY-STONE-ENTERPRISE-CO.%2C-LTD-IHHECHOLY-STONE-ENTERPRISE-CO.%2C-LTD-C0805X222K102T_C2998535.html
footprint CAP-0805 (0805 (2012M) Capacitor)
pins: 1, 2

## C0805X222K251T
designator C?  Capacitance: 2.2nF  (hidden comment: *)
Capacitor, Ceramic (MLCC), 2.2nF, ±10%, 250V, X7R, ±10%, SMD 0805; Manufacturer: IHHEC(HOLY STONE ENTERPRISE CO., LTD); Manufacturer Part Number: C0805X222K251T; Package Size: 0805; JLCPCB Basic Part: No; JLCPCB Part Number: C105955; Supplier 1: LCSC; Category: Capacitors - MLCC; Supplier Part Number 1: C105955; Tolerance: ±10%; Voltage Rating: 250V; Temperature Coefficient: X7R; RoHS: Yes; ComponentLink1Description: Datasheet; ComponentLink1URL: https://wmsc.lcsc.com/wmsc/upload/file/pdf/v2/lcsc/2304140030_IHHEC-HOLY-STONE-ENTERPRISE-CO---LTD-C0805X222K251T_C105955.pdf; ComponentLink2Description: JLCPCB Part URL; ComponentLink2URL: https://jlcpcb.com/partdetail/C105955; ComponentLink3Description: LCSC Part URL; ComponentLink3URL: https://lcsc.com/product-detail/Multilayer-Ceramic-Capacitors-MLCC---SMD-SMT_IHHECHOLY-STONE-ENTERPRISE-CO.%2C-LTD-IHHECHOLY-STONE-ENTERPRISE-CO.%2C-LTD-C0805X222K251T_C105955.html
footprint CAP-0805 (0805 (2012M) Capacitor)
pins: 1, 2

## C0805X223K101T
designator C?  Capacitance: 22nF  (hidden comment: *)
Capacitor, Ceramic (MLCC), 22nF, ±10%, 100V, X7R, ±10%, SMD 0805; Manufacturer: IHHEC(HOLY STONE ENTERPRISE CO., LTD); Manufacturer Part Number: C0805X223K101T; Package Size: 0805; JLCPCB Basic Part: No; JLCPCB Part Number: C2915750; Supplier 1: LCSC; Category: Capacitors - MLCC; Supplier Part Number 1: C2915750; Tolerance: ±10%; Voltage Rating: 100V; Temperature Coefficient: X7R; RoHS: Yes; ComponentLink1Description: Datasheet; ComponentLink1URL: https://wmsc.lcsc.com/wmsc/upload/file/pdf/v2/lcsc/2111172030_IHHEC-HOLY-STONE-ENTERPRISE-CO---LTD-C0805X223K101T_C2915750.pdf; ComponentLink2Description: JLCPCB Part URL; ComponentLink2URL: https://jlcpcb.com/partdetail/C2915750; ComponentLink3Description: LCSC Part URL; ComponentLink3URL: https://lcsc.com/product-detail/Multilayer-Ceramic-Capacitors-MLCC---SMD-SMT_IHHECHOLY-STONE-ENTERPRISE-CO.%2C-LTD-IHHECHOLY-STONE-ENTERPRISE-CO.%2C-LTD-C0805X223K101T_C2915750.html
footprint CAP-0805 (0805 (2012M) Capacitor)
pins: 1, 2

## C0805X223K251T
designator C?  Capacitance: 22nF  (hidden comment: *)
Capacitor, Ceramic (MLCC), 22nF, ±10%, 250V, X7R, ±10%, SMD 0805; Manufacturer: IHHEC(HOLY STONE ENTERPRISE CO., LTD); Manufacturer Part Number: C0805X223K251T; Package Size: 0805; JLCPCB Basic Part: No; JLCPCB Part Number: C105956; Supplier 1: LCSC; Category: Capacitors - MLCC; Supplier Part Number 1: C105956; Tolerance: ±10%; Voltage Rating: 250V; Temperature Coefficient: X7R; RoHS: Yes; ComponentLink1Description: Datasheet; ComponentLink1URL: https://wmsc.lcsc.com/wmsc/upload/file/pdf/v2/lcsc/2304140030_IHHEC-HOLY-STONE-ENTERPRISE-CO---LTD-C0805X223K251T_C105956.pdf; ComponentLink2Description: JLCPCB Part URL; ComponentLink2URL: https://jlcpcb.com/partdetail/C105956; ComponentLink3Description: LCSC Part URL; ComponentLink3URL: https://lcsc.com/product-detail/Multilayer-Ceramic-Capacitors-MLCC---SMD-SMT_IHHECHOLY-STONE-ENTERPRISE-CO.%2C-LTD-IHHECHOLY-STONE-ENTERPRISE-CO.%2C-LTD-C0805X223K251T_C105956.html
footprint CAP-0805 (0805 (2012M) Capacitor)
pins: 1, 2

## C0805X224K101T
designator C?  Capacitance: 220nF  (hidden comment: *)
Capacitor, Ceramic (MLCC), 220nF, ±10%, 100V, X7R, ±10%, SMD 0805; Manufacturer: IHHEC(HOLY STONE ENTERPRISE CO., LTD); Manufacturer Part Number: C0805X224K101T; Package Size: 0805; JLCPCB Basic Part: No; JLCPCB Part Number: C559295; Supplier 1: LCSC; Category: Capacitors - MLCC; Supplier Part Number 1: C559295; Tolerance: ±10%; Voltage Rating: 100V; Temperature Coefficient: X7R; RoHS: Yes; ComponentLink1Description: Datasheet; ComponentLink1URL: https://wmsc.lcsc.com/wmsc/upload/file/pdf/v2/lcsc/2304140030_IHHEC-HOLY-STONE-ENTERPRISE-CO---LTD-C0805X224K101T_C559295.pdf; ComponentLink2Description: JLCPCB Part URL; ComponentLink2URL: https://jlcpcb.com/partdetail/C559295; ComponentLink3Description: LCSC Part URL; ComponentLink3URL: https://lcsc.com/product-detail/Multilayer-Ceramic-Capacitors-MLCC---SMD-SMT_IHHECHOLY-STONE-ENTERPRISE-CO.%2C-LTD-IHHECHOLY-STONE-ENTERPRISE-CO.%2C-LTD-C0805X224K101T_C559295.html
footprint CAP-0805 (0805 (2012M) Capacitor)
pins: 1, 2

## C0805X225K025T
designator C?  Capacitance: 2.2uF  (hidden comment: *)
Capacitor, Ceramic (MLCC), 2.2uF, ±10%, 25V, X7R, ±10%, SMD 0805; Manufacturer: IHHEC(HOLY STONE ENTERPRISE CO., LTD); Manufacturer Part Number: C0805X225K025T; Package Size: 0805; JLCPCB Basic Part: No; JLCPCB Part Number: C337975; Supplier 1: LCSC; Category: Capacitors - MLCC; Supplier Part Number 1: C337975; Tolerance: ±10%; Voltage Rating: 25V; Temperature Coefficient: X7R; RoHS: Yes; ComponentLink1Description: Datasheet; ComponentLink1URL: https://wmsc.lcsc.com/wmsc/upload/file/pdf/v2/lcsc/2304140030_IHHEC-HOLY-STONE-ENTERPRISE-CO---LTD-C0805X225K025T_C337975.pdf; ComponentLink2Description: JLCPCB Part URL; ComponentLink2URL: https://jlcpcb.com/partdetail/C337975; ComponentLink3Description: LCSC Part URL; ComponentLink3URL: https://lcsc.com/product-detail/Multilayer-Ceramic-Capacitors-MLCC---SMD-SMT_IHHECHOLY-STONE-ENTERPRISE-CO.%2C-LTD-IHHECHOLY-STONE-ENTERPRISE-CO.%2C-LTD-C0805X225K025T_C337975.html
footprint CAP-0805 (0805 (2012M) Capacitor)
pins: 1, 2

## C0805X225K050T
designator C?  Capacitance: 2.2uF  (hidden comment: *)
Capacitor, Ceramic (MLCC), 2.2uF, ±10%, 50V, X7R, ±10%, SMD 0805; Manufacturer: IHHEC(HOLY STONE ENTERPRISE CO., LTD); Manufacturer Part Number: C0805X225K050T; Package Size: 0805; JLCPCB Basic Part: No; JLCPCB Part Number: C2915744; Supplier 1: LCSC; Category: Capacitors - MLCC; Supplier Part Number 1: C2915744; Tolerance: ±10%; Voltage Rating: 50V; Temperature Coefficient: X7R; RoHS: Yes; ComponentLink1Description: Datasheet; ComponentLink1URL: https://wmsc.lcsc.com/wmsc/upload/file/pdf/v2/lcsc/2111172030_IHHEC-HOLY-STONE-ENTERPRISE-CO---LTD-C0805X225K050T_C2915744.pdf; ComponentLink2Description: JLCPCB Part URL; ComponentLink2URL: https://jlcpcb.com/partdetail/C2915744; ComponentLink3Description: LCSC Part URL; ComponentLink3URL: https://lcsc.com/product-detail/Multilayer-Ceramic-Capacitors-MLCC---SMD-SMT_IHHECHOLY-STONE-ENTERPRISE-CO.%2C-LTD-IHHECHOLY-STONE-ENTERPRISE-CO.%2C-LTD-C0805X225K050T_C2915744.html
footprint CAP-0805 (0805 (2012M) Capacitor)
pins: 1, 2

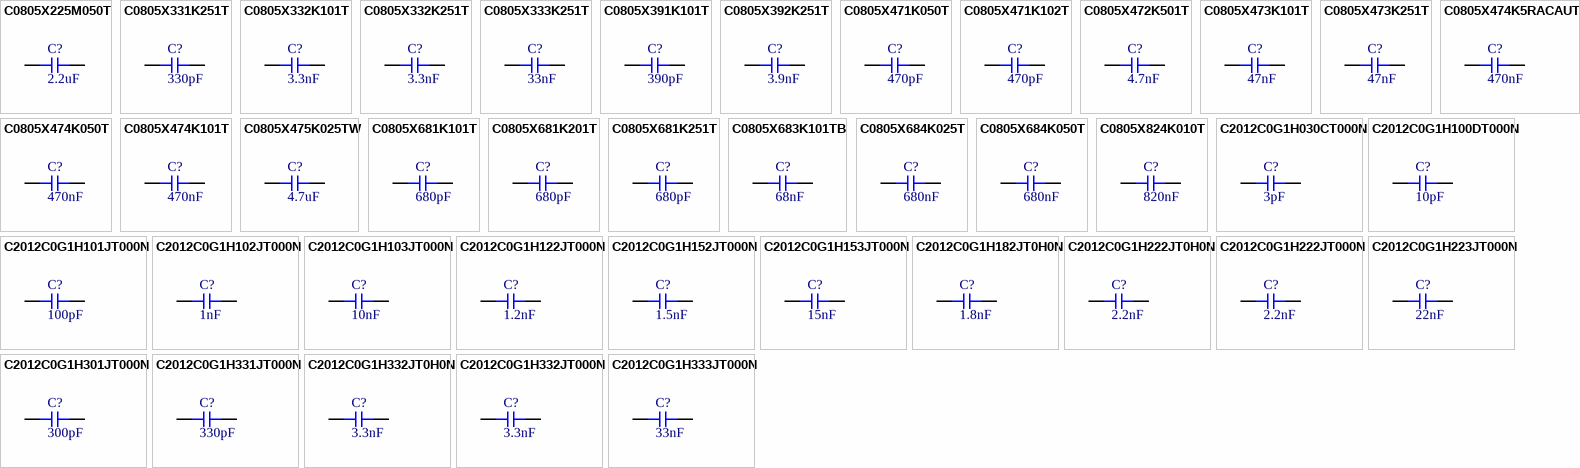
[diagram p26: symbols C0805X225M050T to C2012C0G1H333JT000N]

## C0805X225M050T
designator C?  Capacitance: 2.2uF  (hidden comment: *)
Capacitor, Ceramic (MLCC), 2.2uF, ±20%, 50V, X7R, ±20%, SMD 0805; Manufacturer: IHHEC(HOLY STONE ENTERPRISE CO., LTD); Manufacturer Part Number: C0805X225M050T; Package Size: 0805; JLCPCB Basic Part: No; JLCPCB Part Number: C961513; Supplier 1: LCSC; Category: Capacitors - MLCC; Supplier Part Number 1: C961513; Tolerance: ±20%; Voltage Rating: 50V; Temperature Coefficient: X7R; RoHS: Yes; ComponentLink1Description: Datasheet; ComponentLink1URL: https://wmsc.lcsc.com/wmsc/upload/file/pdf/v2/lcsc/2304140030_IHHEC-HOLY-STONE-ENTERPRISE-CO---LTD-C0805X225M050T_C961513.pdf; ComponentLink2Description: JLCPCB Part URL; ComponentLink2URL: https://jlcpcb.com/partdetail/C961513; ComponentLink3Description: LCSC Part URL; ComponentLink3URL: https://lcsc.com/product-detail/Multilayer-Ceramic-Capacitors-MLCC---SMD-SMT_IHHECHOLY-STONE-ENTERPRISE-CO.%2C-LTD-IHHECHOLY-STONE-ENTERPRISE-CO.%2C-LTD-C0805X225M050T_C961513.html
footprint CAP-0805 (0805 (2012M) Capacitor)
pins: 1, 2

## C0805X331K251T
designator C?  Capacitance: 330pF  (hidden comment: *)
Capacitor, Ceramic (MLCC), 330pF, ±10%, 250V, X7R, ±10%, SMD 0805; Manufacturer: IHHEC(HOLY STONE ENTERPRISE CO., LTD); Manufacturer Part Number: C0805X331K251T; Package Size: 0805; JLCPCB Basic Part: No; JLCPCB Part Number: C105957; Supplier 1: LCSC; Category: Capacitors - MLCC; Supplier Part Number 1: C105957; Tolerance: ±10%; Voltage Rating: 250V; Temperature Coefficient: X7R; RoHS: Yes; ComponentLink1Description: Datasheet; ComponentLink1URL: https://wmsc.lcsc.com/wmsc/upload/file/pdf/v2/lcsc/2304140030_IHHEC-HOLY-STONE-ENTERPRISE-CO---LTD-C0805X331K251T_C105957.pdf; ComponentLink2Description: JLCPCB Part URL; ComponentLink2URL: https://jlcpcb.com/partdetail/C105957; ComponentLink3Description: LCSC Part URL; ComponentLink3URL: https://lcsc.com/product-detail/Multilayer-Ceramic-Capacitors-MLCC---SMD-SMT_IHHECHOLY-STONE-ENTERPRISE-CO.%2C-LTD-IHHECHOLY-STONE-ENTERPRISE-CO.%2C-LTD-C0805X331K251T_C105957.html
footprint CAP-0805 (0805 (2012M) Capacitor)
pins: 1, 2

## C0805X332K101T
designator C?  Capacitance: 3.3nF  (hidden comment: *)
Capacitor, Ceramic (MLCC), 3.3nF, ±10%, 100V, X7R, ±10%, SMD 0805; Manufacturer: IHHEC(HOLY STONE ENTERPRISE CO., LTD); Manufacturer Part Number: C0805X332K101T; Package Size: 0805; JLCPCB Basic Part: No; JLCPCB Part Number: C340309; Supplier 1: LCSC; Category: Capacitors - MLCC; Supplier Part Number 1: C340309; Tolerance: ±10%; Voltage Rating: 100V; Temperature Coefficient: X7R; RoHS: Yes; ComponentLink1Description: Datasheet; ComponentLink1URL: https://wmsc.lcsc.com/wmsc/upload/file/pdf/v2/lcsc/2304140030_IHHEC-HOLY-STONE-ENTERPRISE-CO---LTD-C0805X332K101T_C340309.pdf; ComponentLink2Description: JLCPCB Part URL; ComponentLink2URL: https://jlcpcb.com/partdetail/C340309; ComponentLink3Description: LCSC Part URL; ComponentLink3URL: https://lcsc.com/product-detail/Multilayer-Ceramic-Capacitors-MLCC---SMD-SMT_IHHECHOLY-STONE-ENTERPRISE-CO.%2C-LTD-IHHECHOLY-STONE-ENTERPRISE-CO.%2C-LTD-C0805X332K101T_C340309.html
footprint CAP-0805 (0805 (2012M) Capacitor)
pins: 1, 2
